# Altium footprint library 1MaxPcb.PcbLib: 187 footprints (part 7 of 12)
Each footprint in its own frame and in the unit in brackets; x right, y up, seen from the top. Pads: shape width x height; smd on the part's side, far side on the other; paste and mask are expansions set on the pad; w line width, h text height; cw(c..) or ccw(c..) is an arc to the next point about the centre after c.
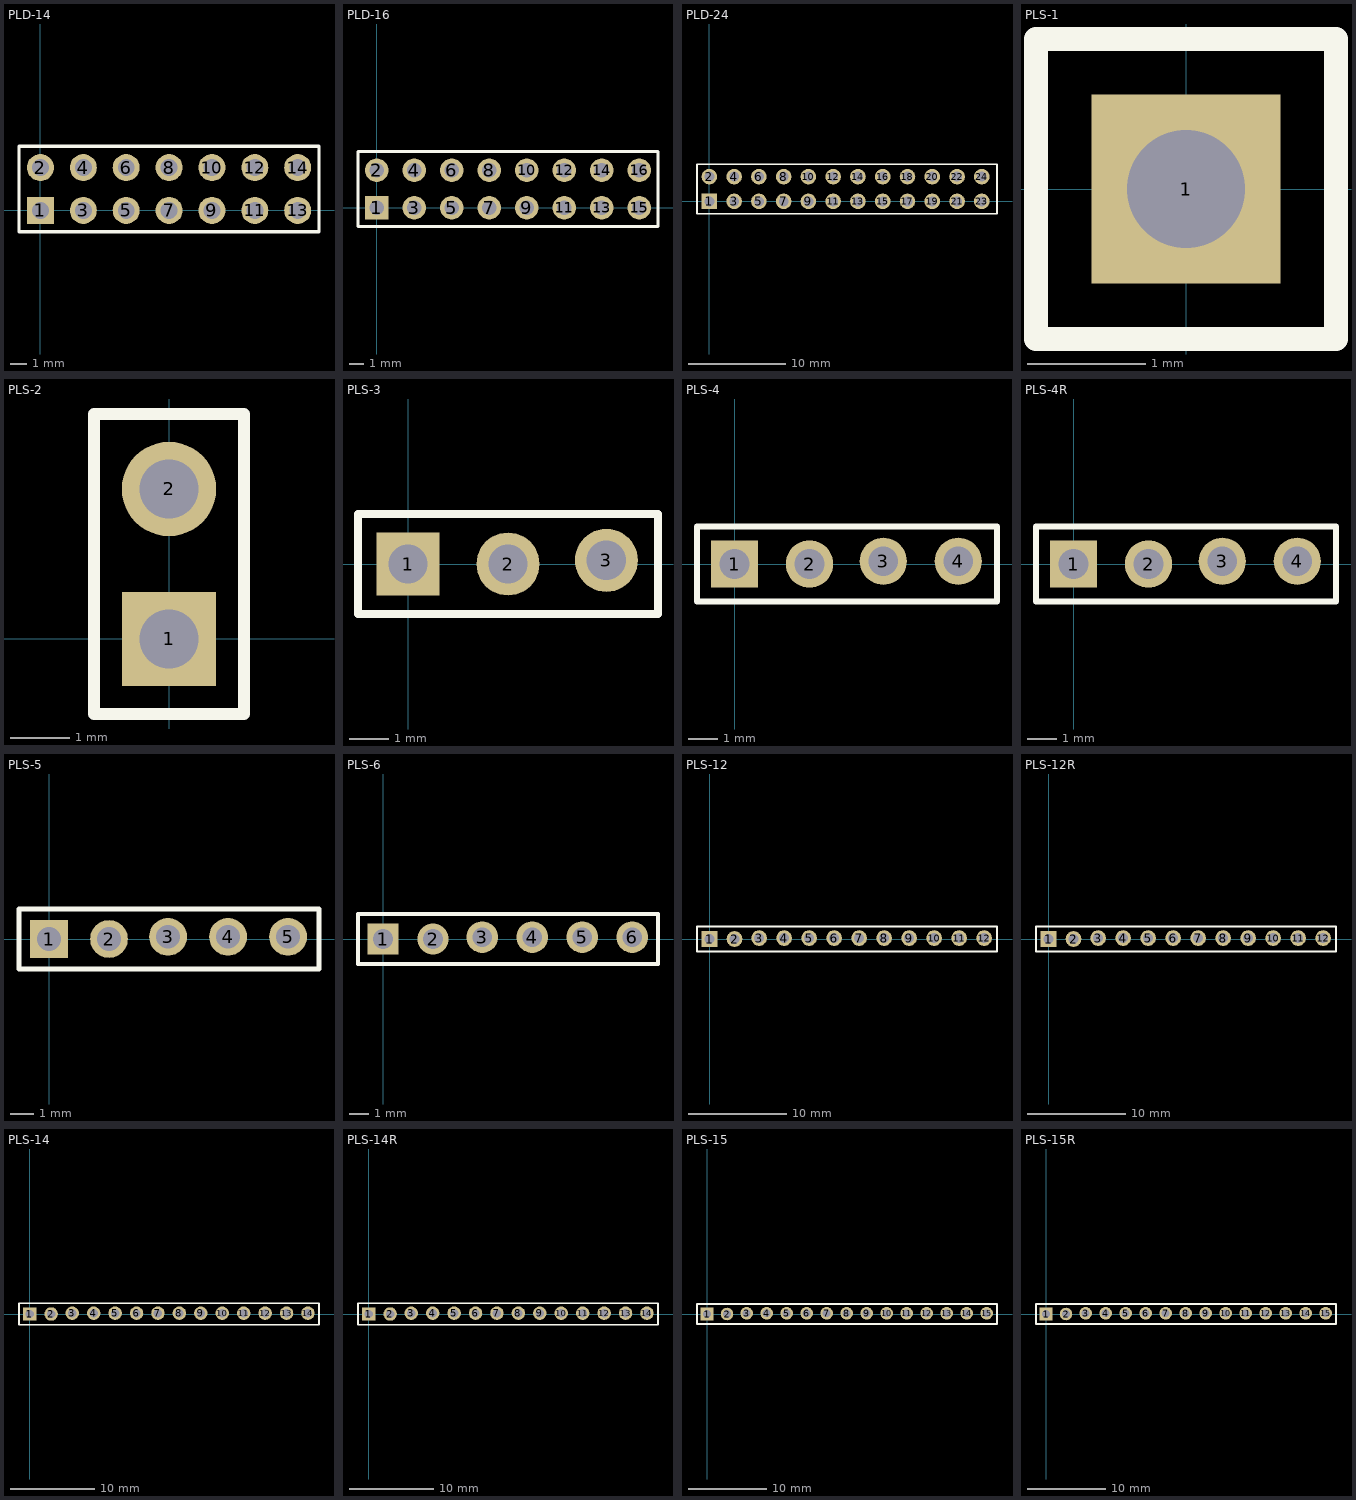
[diagram p6: the footprints below, top view; thin cyan lines are the x and y axes]

## PLD-14 [mm]
height 9
pads (14):
  rect 1.6x1.6 hole 1: 1(0,0)
  round 1.6 hole 1: 2(0,2.54) 3(2.54,0) 4(2.54,2.54) 5(5.08,0) 6(5.08,2.54) 7(7.62,0) 8(7.62,2.54) 9(10.16,0) 10(10.16,2.54) 11(12.7,0) 12(12.7,2.54) 13(15.24,0) 14(15.24,2.54)
Top Overlay:
  lines w0.2: -1.27,-1.27 -1.27,3.81 16.5,3.81 16.5,-1.27 -1.27,-1.27
3D body "DS1021-2x7SF11.stp": height 8.6, standoff -3, extent -1.28,-1.25 16.5,3.75

## PLD-16 [mm]
height 9
pads (16):
  rect 1.6x1.6 hole 1: 1(0,0)
  round 1.6 hole 1: 2(0,2.54) 3(2.54,0) 4(2.54,2.54) 5(5.08,0) 6(5.08,2.54) 7(7.62,0) 8(7.62,2.54) 9(10.16,0) 10(10.16,2.54) 11(12.7,0) 12(12.7,2.54) 13(15.24,0) 14(15.24,2.54) 15(17.78,0) 16(17.78,2.54)
Top Overlay:
  lines w0.2: -1.27,-1.27 -1.27,3.81 19.05,3.81 19.05,-1.27 -1.27,-1.27
3D body "User Library-PLD-16.step": height 8.6, standoff -3, extent -1.27,-1.23 19.05,3.77

## PLD-24 [mm]
height 9
pads (24):
  rect 1.6x1.6 hole 1: 1(0,0)
  round 1.6 hole 1: 2(0,2.54) 3(2.54,0) 4(2.54,2.54) 5(5.08,0) 6(5.08,2.54) 7(7.62,0) 8(7.62,2.54) 9(10.16,0) 10(10.16,2.54) 11(12.7,0) 12(12.7,2.54) 13(15.24,0) 14(15.24,2.54) 15(17.78,0) 16(17.78,2.54) 17(20.32,0) 18(20.32,2.54) 19(22.86,0) 20(22.86,2.54) 21(25.4,0) 22(25.4,2.54) 23(27.94,0) 24(27.94,2.54)
Top Overlay:
  lines w0.2: -1.27,-1.27 -1.27,3.81 29.5,3.81 29.5,-1.27 -1.27,-1.27
3D body "User Library-PLD-16.step": height 8.6, standoff -3, extent 8.89,-1.23 29.21,3.77
3D body "User Library-PLD-16.step": height 8.6, standoff -3, extent -1.27,-1.23 19.05,3.77

## PLS-1 [mm] "PLS-1"
height 9
pads (1):
  rect 1.6x1.6 hole 1: 1(0,0)
Top Overlay:
  lines w0.2: -1.27,-1.27 -1.27,1.27 1.27,1.27 1.27,-1.27 -1.27,-1.27

## PLS-2 [mm] "PLS-2"
height 9
pads (2):
  rect 1.6x1.6 hole 1: 1(0,0)
  round 1.6 hole 1: 2(0,2.54)
Top Overlay:
  lines w0.2: -1.27,-1.27 1.27,-1.27 1.27,3.81 -1.27,3.81 -1.27,-1.27
3D body "User Library-PLS2.STEP": height 8.59, standoff -2.95, extent -1.27,-1.27 1.27,3.81

## PLS-3 [mm] "PLS-3"
height 9
pads (3):
  rect 1.6x1.6 hole 1: 1(0,0)
  round 1.6 hole 1: 2(2.54,0) 3(5.04,0.093)
Top Overlay:
  lines w0.2: -1.27,-1.27 6.35,-1.27 6.35,1.27 -1.27,1.27 -1.27,-1.27
3D body "PLS-3.STEP": height 8.8, standoff -3, extent -1.27,-1.27 6.35,1.27

## PLS-4 [mm] "PLS-4"
height 9
pads (4):
  rect 1.6x1.6 hole 1: 1(0,0)
  round 1.6 hole 1: 2(2.54,0) 3(5.04,0.093) 4(7.58,0.093)
Top Overlay:
  lines w0.2: -1.27,-1.27 8.89,-1.27 8.89,1.27 -1.27,1.27 -1.27,-1.27
3D body "PLS-4.STEP": height 8.8, standoff -3, extent -1.27,-1.27 8.89,1.27

## PLS-4R [mm] "PLS-4R"
height 9
pads (4):
  rect 1.6x1.6 hole 1: 1(0,0)
  round 1.6 hole 1: 2(2.54,0) 3(5.04,0.093) 4(7.58,0.093)
Top Overlay:
  lines w0.2: -1.27,-1.27 -1.27,1.27 8.89,1.27 8.89,-1.27 -1.27,-1.27
3D body "PLS-4R gold.step": height 5.45, standoff -3, extent -1.27,-1.27 8.89,7.35

## PLS-5 [mm] "PLS-5"
height 9
pads (5):
  rect 1.6x1.6 hole 1: 1(0,0)
  round 1.6 hole 1: 2(2.54,0) 3(5.04,0.093) 4(7.58,0.093) 5(10.12,0.093)
Top Overlay:
  lines w0.2: -1.27,-1.27 -1.27,1.27 11.43,1.27 11.43,-1.27 -1.27,-1.27
3D body "PLS-5.STEP": height 8.8, standoff -3, extent -1.27,-1.27 11.43,1.27

## PLS-6 [mm] "PLS-6"
height 9
pads (6):
  rect 1.6x1.6 hole 1: 1(0,0)
  round 1.6 hole 1: 2(2.54,0) 3(5.04,0.093) 4(7.58,0.093) 5(10.12,0.093) 6(12.66,0.093)
Top Overlay:
  lines w0.2: -1.27,-1.27 13.97,-1.27 13.97,1.27 -1.27,1.27 -1.27,-1.27
3D body "PLS-6.STEP": height 8.8, standoff -3, extent -1.27,-1.27 13.97,1.27

## PLS-12 [mm] "PLS-12"
height 9
pads (12):
  rect 1.6x1.6 hole 1: 1(0,0)
  round 1.6 hole 1: 2(2.54,0) 3(5.04,0.093) 4(7.58,0.093) 5(10.12,0.093) 6(12.66,0.093) 7(15.2,0.093) 8(17.74,0.093) 9(20.28,0.093) 10(22.82,0.093) 11(25.36,0.093) 12(27.9,0.093)
Top Overlay:
  lines w0.2: -1.27,-1.27 29.21,-1.27 29.21,1.27 -1.27,1.27 -1.27,-1.27
3D body "PLS-6.STEP": height 8.8, standoff -3, extent 13.97,-1.27 29.21,1.27
3D body "PLS-6.STEP": height 8.8, standoff -3, extent -1.27,-1.27 13.97,1.27

## PLS-12R [mm] "PLS-12R"
height 9
pads (12):
  rect 1.6x1.6 hole 1: 1(0,0)
  round 1.6 hole 1: 2(2.54,0) 3(5.04,0.093) 4(7.58,0.093) 5(10.12,0.093) 6(12.66,0.093) 7(15.2,0.093) 8(17.74,0.093) 9(20.28,0.093) 10(22.82,0.093) 11(25.36,0.093) 12(27.9,0.093)
Top Overlay:
  lines w0.2: -1.27,-1.27 29.21,-1.27 29.21,1.27 -1.27,1.27 -1.27,-1.27
3D body "PLS-6R gold.step": height 5.45, standoff -3, extent -1.27,-1.27 13.97,7.35
3D body "PLS-6R gold.step": height 5.45, standoff -3, extent 13.97,-1.27 29.21,7.35

## PLS-14 [mm]
height 9
pads (14):
  rect 1.6x1.6 hole 1: 1(0,0)
  round 1.6 hole 1: 2(2.54,0) 3(5.04,0.093) 4(7.58,0.093) 5(10.12,0.093) 6(12.66,0.093) 7(15.2,0.093) 8(17.74,0.093) 9(20.28,0.093) 10(22.82,0.093) 11(25.36,0.093) 12(27.9,0.093) 13(30.44,0.093) 14(32.98,0.093)
Top Overlay:
  lines w0.2: -1.27,-1.27 -1.27,1.27 34.29,1.27 34.29,0.635 34.29,-0.635 34.29,-1.27 -1.27,-1.27
3D body "PLS-7.step": height 8.54, standoff -3, extent 16.51,-1.27 34.29,1.27
3D body "PLS-7.step": height 8.54, standoff -3, extent -1.27,-1.27 16.51,1.27

## PLS-14R [mm] "PLS-14R"
height 9
pads (14):
  rect 1.6x1.6 hole 1: 1(0,0)
  round 1.6 hole 1: 2(2.54,0) 3(5.04,0.093) 4(7.58,0.093) 5(10.12,0.093) 6(12.66,0.093) 7(15.2,0.093) 8(17.74,0.093) 9(20.28,0.093) 10(22.82,0.093) 11(25.36,0.093) 12(27.9,0.093) 13(30.44,0.093) 14(32.98,0.093)
Top Overlay:
  lines w0.2: -1.27,-1.27 34.29,-1.27 34.29,-0.635 34.29,0.635 34.29,1.27 -1.27,1.27 -1.27,-1.27
3D body "PLS-7R gold.step": height 5.45, standoff -3, extent 16.51,-1.27 34.29,7.35
3D body "PLS-7R gold.step": height 5.45, standoff -3, extent -1.27,-1.27 16.51,7.35

## PLS-15 [mm]
height 9
pads (15):
  rect 1.6x1.6 hole 1: 1(0,0)
  round 1.6 hole 1: 2(2.54,0) 3(5.04,0.093) 4(7.58,0.093) 5(10.12,0.093) 6(12.66,0.093) 7(15.2,0.093) 8(17.74,0.093) 9(20.28,0.093) 10(22.82,0.093) 11(25.36,0.093) 12(27.9,0.093) 13(30.44,0.093) 14(32.98,0.093) 15(35.52,0.093)
Top Overlay:
  lines w0.2: -1.27,-1.27 36.83,-1.27 36.83,1.27 -1.27,1.27 -1.27,-1.27
3D body "PLS-7.step": height 8.54, standoff -3, extent 19.05,-1.27 36.83,1.27
3D body "PLS-8.STEP": height 8.8, standoff -3, extent -1.27,-1.27 19.05,1.27

## PLS-15R [mm] "PLS-15R"
height 9
pads (15):
  rect 1.6x1.6 hole 1: 1(0,0)
  round 1.6 hole 1: 2(2.54,0) 3(5.04,0.093) 4(7.58,0.093) 5(10.12,0.093) 6(12.66,0.093) 7(15.2,0.093) 8(17.74,0.093) 9(20.28,0.093) 10(22.82,0.093) 11(25.36,0.093) 12(27.9,0.093) 13(30.44,0.093) 14(32.98,0.093) 15(35.52,0.093)
Top Overlay:
  lines w0.2: -1.27,-1.27 -1.27,1.27 36.83,1.27 36.83,-1.27 -1.27,-1.27
3D body "PLS-8R gold.step": height 5.45, standoff -3, extent 16.51,-1.27 36.83,7.35
3D body "PLS-7R gold.step": height 5.45, standoff -3, extent -1.27,-1.27 16.51,7.35